# Altium footprint library spider.PcbLib: 53 footprints (part 1 of 4)
Each footprint in its own frame and in the unit in brackets; x right, y up, seen from the top. Pads: shape width x height; smd on the part's side, far side on the other; paste and mask are expansions set on the pad; w line width, h text height; cw(c..) or ccw(c..) is an arc to the next point about the centre after c.
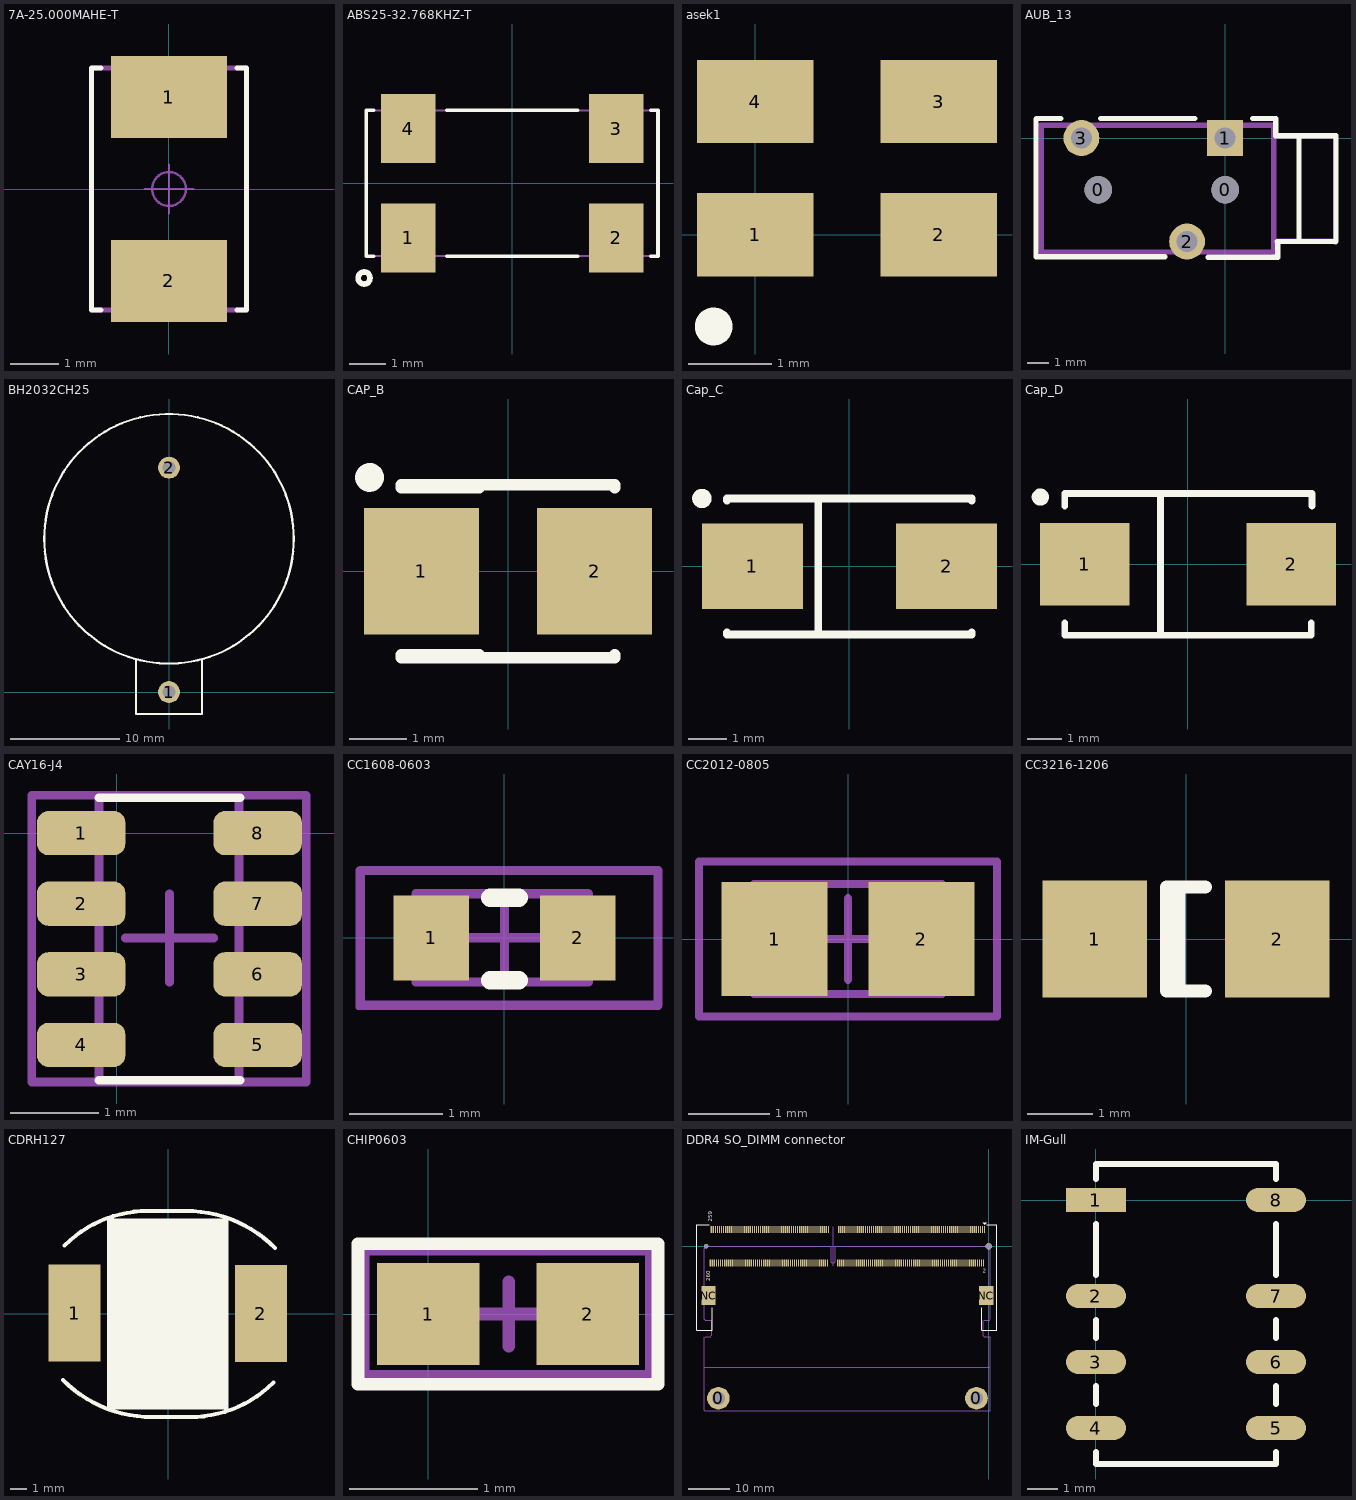
[diagram p0: the footprints below, top view; thin cyan lines are the x and y axes]

## 7A-25.000MAHE-T [mm] "SMD Oscillator, side convave, 4 pins, 5.00x3.2mm"
height 1.6
pads (2):
  rect 2.4x1.7 smd: 1(0,1.9) 2(0,-1.9)
Top Overlay:
  lines w0.1: -1.4,-2.5 -1.6,-2.5 -1.6,2.5 -1.4,2.5 ; 1.4,-2.5 1.6,-2.5 1.6,2.5 1.4,2.5
Mechanical 2:
  lines w0.05: -1.6,-2.5 -1.6,2.5 1.6,2.5 1.6,-2.5 -1.6,-2.5
  text ".designator" at 0.2,-2.675 h0.5
Mechanical 14:
  lines w0.1: -1.6,-2.5 -1.6,2.5 1.6,2.5 1.6,-2.5 -1.6,-2.5
Mechanical 15:
  circle w0.05: c0,0 r0.35
  lines w0.05: -0.5,0 0.5,0 ; 0,-0.5 0,0.5
3D body "User Library-GeyerElectronics_KX9B.step": height 1.12, standoff 0, extent -1.58,-2.48 1.63,2.53

## ABS25-32.768KHZ-T [mm]
pads (4):
  rect 1.5x1.9 smd mask+0.02: 1(-2.85,-1.5) 2(2.85,-1.5) 3(2.85,1.5) 4(-2.85,1.5)
Top Overlay:
  circle w0.15: c-4.066,-2.6 r0.166
  lines w0.1: -3.8,-2 -4,-2 -4,2 -3.8,2 ; -1.8,-2 1.8,-2 ; -1.8,2 1.8,2 ; 3.8,-2 4,-2 4,2 3.8,2
Mechanical 2:
  lines w0.05: -3.975,-2 4,-2 4,2 -3.975,2 -3.975,-2
  text ".designator" at -2.2,-0.15 h0.5
3D body "SW3dPS-ZM206.STEP": height 2.43, standoff -0.1, extent -4.004,-1.898 3.996,1.902

## asek1 [mm]
pads (4):
  rect 1.4x1 smd: 1(0,0) 2(2.2,0) 3(2.2,1.6) 4(0,1.6)
Top Overlay:
  circle w0.254: c-0.5,-1.1 r0.1
3D body "User Library-TC32.STEP": height 1, standoff -0.01, extent -0.526,-0.458 2.674,2.042

## AUB_13 [mm] "3.5mm audio jack, PTH on pcb, 3 contacts"
height 5
pads (5):
  round 1.3 hole 1.3 unplated: 0(-6,-2.45) 0(0,-2.45)
  rect 1.7x1.7 hole 1: 1(0,0)
  round 1.7 hole 1: 2(-1.8,-4.9) 3(-6.8,0)
Top Overlay:
  lines w0.254: -7.775,0.925 -8.925,0.925 -8.95,0.9 -8.95,-5.625 -2.85,-5.625 ; -5.9,0.925 -1.425,0.925 ; -0.8,-5.65 2.5,-5.65 2.5,-4.925 ; 1.3,0.925 2.4,0.925 2.4,0.1 5.25,0.1 5.25,-4.9 3.5,-4.9 3.5,0.1 ; 2.475,-4.9 5.225,-4.9
Mechanical 15:
  lines w0.254: -8.725,0.6 2.275,0.6 ; -8.7,-5.4 -8.7,0.6 ; -8.675,-5.375 2.275,-5.401 ; 2.3,-5.4 2.3,0.6 ; 2.3,-4.875 5.225,-4.875 ; 2.3,0.1 5.2,0.1 ; 5.225,-4.925 5.225,0.05
3D body "User Library-minijack.STEP": height 5, standoff -2, extent -8.778,-5.334 5.222,0.666

## BH2032CH25 [mm]
pads (2):
  round 2 hole 1.2: 1(0,0) 2(0,20.5)
Top Overlay:
  circle w0.2: c0,14 r11.4
  lines w0.2: -3,3 -3,-2 3,-2 3,3
3D body "User Library-CR 2032 (Battery Holder)-1.STEP": height 7.35, standoff -3.2, extent -11.45,-3.275 11.3,25.425

## CAP_B [mm] "Capacitor, SM Tantalum; Body 3.5 x 2.8 mm (LxW typ)"
height 2.1
pads (2):
  rect 2x2.2 smd: 1(-1.5,0) 2(1.5,0)
Top Overlay:
  circle w0.25: c-2.4,1.625 r0.125
  lines w0.2: -1.85,-1.5 1.85,-1.5 1.85,-1.45 ; -1.85,-1.45 -0.5,-1.45 ; -1.85,1.45 -0.5,1.45 ; -1.85,1.5 1.85,1.5 1.85,1.45
3D body "User Library-QT02752.STEP": height 0.95, standoff -0.96, extent -1.831,-1.4 1.832,1.4

## Cap_C [mm] "Capacitor, SM Tantalum; Body 6.0 x 3.2 mm (LxW typ)"
height 3.4
pads (2):
  rect 2.6x2.2 smd: 1(-2.5,0) 2(2.5,0)
Top Overlay:
  circle w0.25: c-3.8,1.75 r0.125
  lines w0.2: -3.15,-1.7 -3.15,-1.75 3.15,-1.75 3.15,-1.7 ; -3.15,1.7 -3.15,1.75 3.15,1.75 3.15,1.7 ; -0.8,-1.75 -0.8,1.75
3D body "CAP_TANT_6032-28_y.STEP": height 2.8, standoff 0, extent -3.15,-1.75 3.15,1.75

## Cap_D [mm] "Capacitor, SM Tantalum; Body 7.3 x 4.3 mm (LxW typ)"
height 2.8
pads (2):
  rect 2.6x2.4 smd: 1(-3,0) 2(3,0)
Top Overlay:
  circle w0.25: c-4.291,1.956 r0.125
  lines w0.2: -3.581,-1.7 -3.581,-2.057 3.581,-2.057 3.581,-1.7 ; -3.581,1.7 -3.581,2.057 3.607,2.057 3.607,1.7 ; -0.8,-2.057 -0.8,2.057
3D body "User Library-CaseD_7343-31.STEP": height 2.8, standoff 0, extent -3.65,-2.15 3.65,2.15

## CAY16-J4 [mm]
height 0.6
pads (8):
  rrect50% 1x0.5 smd: 1(-0.4,0) 2(-0.4,-0.8) 3(-0.4,-1.6) 4(-0.4,-2.4) 5(1.6,-2.4) 6(1.6,-1.6) 7(1.6,-0.8) 8(1.6,0)
Top Overlay:
  lines w0.1: -0.2,-2.8 1.4,-2.8 ; -0.2,0.4 1.4,0.4
Mechanical 13:
  lines w0.1: -0.2,-2.81 1.39,-2.81 1.39,0.43 -0.2,0.43 -0.2,-2.81
Mechanical 15:
  lines w0.1: 0.1,-1.19 1.1,-1.19 ; 0.6,-1.69 0.6,-0.69 ; -0.96,-2.82 2.15,-2.82 2.15,0.43 -0.96,0.43 -0.96,-2.82
3D body "User Library-YC164.STEP": height 0.55, standoff 0, extent -0.19,-2.768 1.41,0.432
3D body "User Library-Array-1206-4Way-Var2-1.STEP": height 0.5, standoff 0, extent -0.191,-2.768 1.409,0.432

## CC1608-0603 [mil] "Chip Capacitor, 2-Leads, Body 1,6x0,8mm, IPC Medium Density"
height 17.72
pads (2):
  rect 32x36 smd: 1(-31,0) 2(31,0)
Top Overlay:
  lines w7.87: -6,-18 6,-18 ; -6,17 6,17
Mechanical 2:
  lines w1.97: -62.01,-29.53 -62.01,28.54 64.96,28.54 64.96,-29.53 -62.01,-29.53
  text ".designator" at -43.31,-10.83 h19.68
Mechanical 13:
  lines w3.94: -37.42,-18.7 35.42,-18.7 35.42,18.7 -37.42,18.7 -37.42,-18.7
Mechanical 15:
  lines w3.94: -18.7,0 18.7,0 ; 0,-18.7 0,18.7 ; -60.99,-28.54 -60.99,28.54 64.99,28.54 64.99,-28.54 -60.99,-28.54
3D body "User Library-cap_0603-1.STEP": height 31.5, standoff 0, extent -31.49,-15.74 31.5,15.75

## CC2012-0805 [mm] "Chip Capacitor, 2-Leads, Body 2,0x1,25mm, IPC Medium Density"
height 0.6
pads (2):
  rect 1.3x1.4 smd: 1(-0.9,0) 2(0.9,0)
Mechanical 2:
  lines w0.05: -1.85,0.925 -1.85,-0.925 1.825,-0.925 1.825,0.95 -1.85,0.95
  text ".designator" at -1.525,-0.225 h0.5
Mechanical 13:
  lines w0.1: -1.15,-0.675 -1.15,0.675 1.15,0.675 1.15,-0.675 -1.15,-0.675
Mechanical 15:
  lines w0.1: -0.5,0 0.5,0 ; 0,-0.5 0,0.5 ; -1.825,-0.95 -1.825,0.95 1.825,0.95 1.825,-0.95 -1.825,-0.95
3D body "User Library-cap_0805-1.STEP": height 1.2, standoff 0, extent -1,-0.6 1,0.6

## CC3216-1206 [mm] "Chip Capacitor; Body 3.2 x 1.6 mm (LxW typ)"
height 1.35
pads (2):
  rect 1.6x1.8 smd: 1(-1.4,0) 2(1.4,0)
Top Overlay:
  lines w0.2: -0.11,-0.8 -0.11,0.8 ; 0.3,-0.8 -0.3,-0.8 -0.3,0.8 0.3,0.8
3D body "User Library-CAPC3216X10.STEP": height 1, standoff 0, extent -1.6,-0.8 1.6,0.8

## CDRH127 [mm]
pads (2):
  rect 3.2x6 smd: 1(-5.791,0.025) 2(5.74,0)
Top Overlay:
  rectangle: -3.785,-5.944 3.734,5.867
  lines w0.254: -6.509,-4.108 ccw(c-0.974,1.426) -0.974,-6.401 1.351,-6.401 ccw(c1.351,0.885) 6.503,-4.267 ; -6.401,4.216 cw(c-1.249,-0.936) -1.249,6.35 1.076,6.35 cw(c1.076,-1.477) 6.61,4.058
3D body "SUMIDA-CDRH127-DEFAULT.STEP": height 7.5, standoff 0.05, extent -6.068,-6.107 6.274,5.893

## CHIP0603 [mm]
height 0.7
pads (2):
  rect 0.8x0.8 smd: 1(0,0) 2(1.25,0)
Top Overlay:
  lines w0.1: -0.55,-0.55 1.8,-0.55 1.8,0.55 -0.55,0.55 -0.55,-0.55
Mechanical 13:
  lines w0.1: -0.51,-0.49 1.75,-0.49 1.75,0.51 -0.51,0.51 -0.51,-0.49
Mechanical 15:
  lines w0.1: 0.38,0 0.88,0 ; 0.63,-0.25 0.63,0.25 ; -0.51,-0.49 1.75,-0.49 1.75,0.516 -0.51,0.516 -0.51,-0.49
3D body: height 0.7, standoff 0.1, extent -0.525,-0.5 1.75,0.51
3D body "Chip InductorINDC1608X95N.STEP": height 0.95, standoff 0, extent -0.165,-0.4 1.435,0.4

## DDR4 SO_DIMM connector [mm] "2309407-1"
pads (264):
  round 5.5 hole 3.2: 0(-65.8,-37) 0(-3,-37)
  rrect30% 0.3x1.75 smd mask+0.05: 1(-1.025,4.1) 2(-1.275,-4.1) 3(-1.525,4.1) 4(-1.775,-4.1) 5(-2.025,4.1) 6(-2.275,-4.1) 7(-2.525,4.1) 8(-2.775,-4.1) 9(-3.025,4.1) 10(-3.275,-4.1) 11(-3.525,4.1) 12(-3.775,-4.1) 13(-4.025,4.1) 14(-4.275,-4.1) 15(-4.525,4.1) 16(-4.775,-4.1) 17(-5.025,4.1) 18(-5.275,-4.1) 19(-5.525,4.1) 20(-5.775,-4.1) 21(-6.025,4.1) 22(-6.275,-4.1) 23(-6.525,4.1) 24(-6.775,-4.1) 25(-7.025,4.1) 26(-7.275,-4.1) 27(-7.525,4.1) 28(-7.775,-4.1) 29(-8.025,4.1) 30(-8.275,-4.1) 31(-8.525,4.1) 32(-8.775,-4.1) 33(-9.025,4.1) 34(-9.275,-4.1) 35(-9.525,4.1) 36(-9.775,-4.1) 37(-10.025,4.1) 38(-10.275,-4.1) 39(-10.525,4.1) 40(-10.775,-4.1) 41(-11.025,4.1) 42(-11.275,-4.1) 43(-11.525,4.1) 44(-11.775,-4.1) 45(-12.025,4.1) 46(-12.275,-4.1) 47(-12.525,4.1) 48(-12.775,-4.1) 49(-13.025,4.1) 50(-13.275,-4.1) 51(-13.525,4.1) 52(-13.775,-4.1) 53(-14.025,4.1) 54(-14.275,-4.1) 55(-14.525,4.1) 56(-14.775,-4.1) 57(-15.025,4.1) 58(-15.275,-4.1) 59(-15.525,4.1) 60(-15.775,-4.1) 61(-16.025,4.1) 62(-16.275,-4.1) 63(-16.525,4.1) 64(-16.775,-4.1) 65(-17.025,4.1) 66(-17.275,-4.1) 67(-17.525,4.1) 68(-17.775,-4.1) 69(-18.025,4.1) 70(-18.275,-4.1) 71(-18.525,4.1) 72(-18.775,-4.1) 73(-19.025,4.1) 74(-19.275,-4.1) 75(-19.525,4.1) 76(-19.775,-4.1) 77(-20.025,4.1) 78(-20.275,-4.1) 79(-20.525,4.1) 80(-20.775,-4.1) 81(-21.025,4.1) 82(-21.275,-4.1) 83(-21.525,4.1) 84(-21.775,-4.1) 85(-22.025,4.1) 86(-22.275,-4.1) 87(-22.525,4.1) 88(-22.775,-4.1) 89(-23.025,4.1) 90(-23.275,-4.1) 91(-23.525,4.1) 92(-23.775,-4.1) 93(-24.025,4.1) 94(-24.275,-4.1) 95(-24.525,4.1) 96(-24.775,-4.1) 97(-25.025,4.1) 98(-25.275,-4.1) 99(-25.525,4.1) 100(-25.775,-4.1) 101(-26.025,4.1) 102(-26.275,-4.1) 103(-26.525,4.1) 104(-26.775,-4.1) 105(-27.025,4.1) 106(-27.275,-4.1) 107(-27.525,4.1) 108(-27.775,-4.1) 109(-28.025,4.1) 110(-28.275,-4.1) 111(-28.525,4.1) 112(-28.775,-4.1) 113(-29.025,4.1) 114(-29.275,-4.1) 115(-29.525,4.1) 116(-29.775,-4.1) 117(-30.025,4.1) 118(-30.275,-4.1) 119(-30.525,4.1) 120(-30.775,-4.1) 121(-31.025,4.1) 122(-31.275,-4.1) 123(-31.525,4.1) 124(-31.775,-4.1) 125(-32.025,4.1) 126(-32.275,-4.1) 127(-32.525,4.1) 128(-32.775,-4.1) 129(-33.025,4.1) 130(-33.275,-4.1) 131(-33.525,4.1) 132(-33.775,-4.1) 133(-34.025,4.1) 134(-34.275,-4.1) 135(-34.525,4.1) 136(-34.775,-4.1) 137(-35.025,4.1) 138(-35.275,-4.1) 139(-35.525,4.1) 140(-35.775,-4.1) 141(-36.025,4.1) 142(-36.275,-4.1) 143(-36.525,4.1) 144(-36.775,-4.1) 145(-39.025,4.1) 146(-39.275,-4.1) 147(-39.525,4.1) 148(-39.775,-4.1) 149(-40.025,4.1) 150(-40.275,-4.1) 151(-40.525,4.1) 152(-40.775,-4.1) 153(-41.025,4.1) 154(-41.275,-4.1) 155(-41.525,4.1) 156(-41.775,-4.1) 157(-42.025,4.1) 158(-42.275,-4.1) 159(-42.525,4.1) 160(-42.775,-4.1) 161(-43.025,4.1) 162(-43.275,-4.1) 163(-43.525,4.1) 164(-43.775,-4.1) 165(-44.025,4.1) 166(-44.275,-4.1) 167(-44.525,4.1) 168(-44.775,-4.1) 169(-45.025,4.1) 170(-45.275,-4.1) 171(-45.525,4.1) 172(-45.775,-4.1) 173(-46.025,4.1) 174(-46.275,-4.1) 175(-46.525,4.1) 176(-46.775,-4.1) 177(-47.025,4.1) 178(-47.275,-4.1) 179(-47.525,4.1) 180(-47.775,-4.1) 181(-48.025,4.1) 182(-48.275,-4.1) 183(-48.525,4.1) 184(-48.775,-4.1) 185(-49.025,4.1) 186(-49.275,-4.1) 187(-49.525,4.1) 188(-49.775,-4.1) 189(-50.025,4.1) 190(-50.275,-4.1) 191(-50.525,4.1) 192(-50.775,-4.1) 193(-51.025,4.1) 194(-51.275,-4.1) 195(-51.525,4.1) 196(-51.775,-4.1) 197(-52.025,4.1) 198(-52.275,-4.1) 199(-52.525,4.1) 200(-52.775,-4.1) 201(-53.025,4.1) 202(-53.275,-4.1) 203(-53.525,4.1) 204(-53.775,-4.1) 205(-54.025,4.1) 206(-54.275,-4.1) 207(-54.525,4.1) 208(-54.775,-4.1) 209(-55.025,4.1) 210(-55.275,-4.1) 211(-55.525,4.1) 212(-55.775,-4.1) 213(-56.025,4.1) 214(-56.275,-4.1) 215(-56.525,4.1) 216(-56.775,-4.1) 217(-57.025,4.1) 218(-57.275,-4.1) 219(-57.525,4.1) 220(-57.775,-4.1) 221(-58.025,4.1) 222(-58.275,-4.1) 223(-58.525,4.1) 224(-58.775,-4.1) 225(-59.025,4.1) 226(-59.275,-4.1) 227(-59.525,4.1) 228(-59.775,-4.1) 229(-60.025,4.1) 230(-60.275,-4.1) 231(-60.525,4.1) 232(-60.775,-4.1) 233(-61.025,4.1) 234(-61.275,-4.1) 235(-61.525,4.1) 236(-61.775,-4.1) 237(-62.025,4.1) 238(-62.275,-4.1) 239(-62.525,4.1) 240(-62.775,-4.1) 241(-63.025,4.1) 242(-63.275,-4.1) 243(-63.525,4.1) 244(-63.775,-4.1) 245(-64.025,4.1) 246(-64.275,-4.1) 247(-64.525,4.1) 248(-64.775,-4.1) 249(-65.025,4.1) 250(-65.275,-4.1) 251(-65.525,4.1) 252(-65.775,-4.1) 253(-66.025,4.1) 254(-66.275,-4.1) 255(-66.525,4.1) 256(-66.775,-4.1) 257(-67.025,4.1) 258(-67.275,-4.1) 259(-67.525,4.1) 260(-67.775,-4.1)
  rect 3.5x4.6 smd mask+0.05: NC(-68.2,-12) NC(-0.6,-12)
via -68.8,0 diameter 1.1 hole 1.1
via 0,0 diameter 1.6 hole 1.6
Top Overlay:
  region: -1,5.25 -1.5,5.75 -0.5,5.75
  lines w0.15: -0.5,5.25 2,5.25
  lines w0.2: -68,5.25 -71,5.25 -71,-20.5 -67.25,-20.5 -67.25,-15 ; -1.75,-15 -1.75,-20.5 2,-20.5 2,5.25
  text "2" at -1.5,-6.5 h1
  text "259" at -67.25,6 h1
  text "260" at -67.75,-8.5 h1
Mechanical 1:
  lines w0.05: -37.9,-4.75 -37.9,4.75
  lines w0.1: 0.319,-29.5 -69.172,-29.5 ; 0.39,-39.994 -69.102,-39.994 ; -69.196,-39.9 -69.196,-22.2 ; -69.196,-39.9 -69.102,-39.994 ; -69.196,-39.9 -69.196,-22.2 ; -69.196,-39.9 -69.102,-39.994 ; -69.196,-39.9 -69.196,-22.2 ; -69.196,-39.9 -69.102,-39.994 ; -69.196,-22.2 -68.996,-22 ; -69.196,-22.2 -68.996,-22 ; -69.196,-22.2 -68.996,-22 ; -69.196,-17.8 -68.996,-18 ; -69.196,-17.8 -69.196,-0.6 ; -69.196,-17.8 -68.996,-18 ; -69.196,-17.8 -69.196,-0.6 ; -69.196,-17.8 -68.996,-18 ; -69.196,-17.8 -69.196,-0.6 ; -69.196,-0.6 -68.596,0 ; -69.196,-0.6 -68.596,0 ; -69.196,-0.6 -68.596,0 ; -69.172,-29.5 0.33,-29.5 -69.172,-29.5 ; -69.102,-39.994 0.4,-39.994 ; -69.102,-39.994 0.4,-39.994 ; -68.996,-22 -67.696,-22 ; -68.996,-22 -67.696,-22 ; -68.996,-22 -67.696,-22 ; -68.996,-18 -67.696,-18 ; -68.996,-18 -67.696,-18 ; -68.996,-18 -67.696,-18 ; -68.596,0 -38.6,0 ; -68.596,0 -38.6,0 ; -68.596,0 -38.6,0 ; -67.696,-22 -67.496,-21.8 ; -67.696,-22 -67.496,-21.8 ; -67.696,-22 -67.496,-21.8 ; -67.696,-18 -67.496,-18.2 ; -67.696,-18 -67.496,-18.2 ; -67.696,-18 -67.496,-18.2 ; -67.496,-21.8 -67.496,-18.2 ; -67.496,-21.8 -67.496,-18.2 ; -67.496,-21.8 -67.496,-18.2 ; -38.6,0 -38.4,-0.2 ; -38.6,0 -38.4,-0.2 ; -38.6,0 -38.4,-0.2 ; -38.4,-3.8 -38.4,-0.2 ; -38.4,-3.8 -38.2,-4 ; -38.4,-3.8 -38.4,-0.2 ; -38.4,-3.8 -38.2,-4 ; -38.4,-3.8 -38.4,-0.2 ; -38.4,-3.8 -38.2,-4 ; -38.2,-4 -37.6,-4 ; -38.2,-4 -37.6,-4 ; -38.2,-4 -37.6,-4 ; -37.6,-4 -37.4,-3.8 ; -37.6,-4 -37.4,-3.8 ; -37.6,-4 -37.4,-3.8 ; -37.4,-3.8 -37.4,-0.2 ; -37.4,-3.8 -37.4,-0.2 ; -37.4,-3.8 -37.4,-0.2 ; -37.4,-0.2 -37.2,0 ; -37.4,-0.2 -37.2,0 ; -37.4,-0.2 -37.2,0 ; -37.2,0 -0.2,0 ; -37.2,0 -0.2,0 ; -37.2,0 -0.224,0 -0.205,-0.019 ; -1.3,-21.8 -1.3,-18.2 ; -1.3,-21.8 -1.1,-22 ; -1.3,-21.8 -1.3,-18.2 ; -1.3,-21.8 -1.1,-22 ; -1.3,-21.8 -1.3,-18.2 ; -1.3,-21.8 -1.1,-22 ; -1.3,-18.2 -1.1,-18 ; -1.3,-18.2 -1.1,-18 ; -1.3,-18.2 -1.1,-18 ; -1.1,-22 0.2,-22 ; -1.1,-22 0.2,-22 ; -1.1,-22 0.2,-22 ; -1.1,-18 0.2,-18 ; -1.1,-18 0.2,-18 ; -1.1,-18 0.2,-18 ; -0.205,-0.019 0.4,-0.624 ; -0.205,-0.019 -0.2,0 ; -0.205,-0.019 0.4,-0.624 ; -0.205,-0.019 -0.2,0 ; -0.205,-0.019 0.4,-0.624 ; 0.2,-22 0.4,-22.2 ; 0.2,-22 0.4,-22.2 ; 0.2,-22 0.4,-22.2 ; 0.2,-18 0.4,-17.8 ; 0.2,-18 0.4,-17.8 ; 0.2,-18 0.4,-17.8 ; 0.4,-39.994 0.4,-22.2 ; 0.4,-17.8 0.4,-0.624
  text "Standart DDR4 SO-DIMM" at -53.92,-28.75 h3
  text "AM43x SPIDER" at -49.17,-39.25 h3
3D body: height 3.1, standoff 1.9, extent -5.997,-39.999 0,-34.001
3D body: height 3.1, standoff 1.9, extent -68.797,-39.999 -62.8,-34.001
3D body: height 3, standoff 2, extent -69.25,-39.994 0.39,0
3D body "c-2309407-1-1-3d.stp": height 4.15, standoff -0.35, extent -71,-20.85 2,5

## IM-Gull [mm] "IM Relay SMD"
pads (8):
  rect 2x0.8 smd: 1(0,0)
  oval 2x0.8 smd: 2(0,-3.2) 3(0,-5.4) 4(0,-7.6) 5(6,-7.6) 6(6,-5.4) 7(6,-3.2) 8(6,0)
Top Overlay:
  lines w0.2: 0,-8.4 0,-8.8 6,-8.8 6,-8.4 ; 0,-6.8 0,-6.2 ; 0,-4.6 0,-4 ; 0,-2.5 0,-0.8 ; 0,0.7 0,1.2 6,1.2 6,0.7 ; 6,-6.8 6,-6.2 ; 6,-4.6 6,-4 ; 6,-2.5 6,-0.8
3D body "c-1462037-2-a-3d.stp": height 5.65, standoff 0, extent -0.758,-8.8 6.758,1.2